# Altium integrated library Lattice CPLD ispLSI.IntLib: 471 symbols (part 12 of 26) (continued)
## ispLSI2128VE-250LT176 (continued)
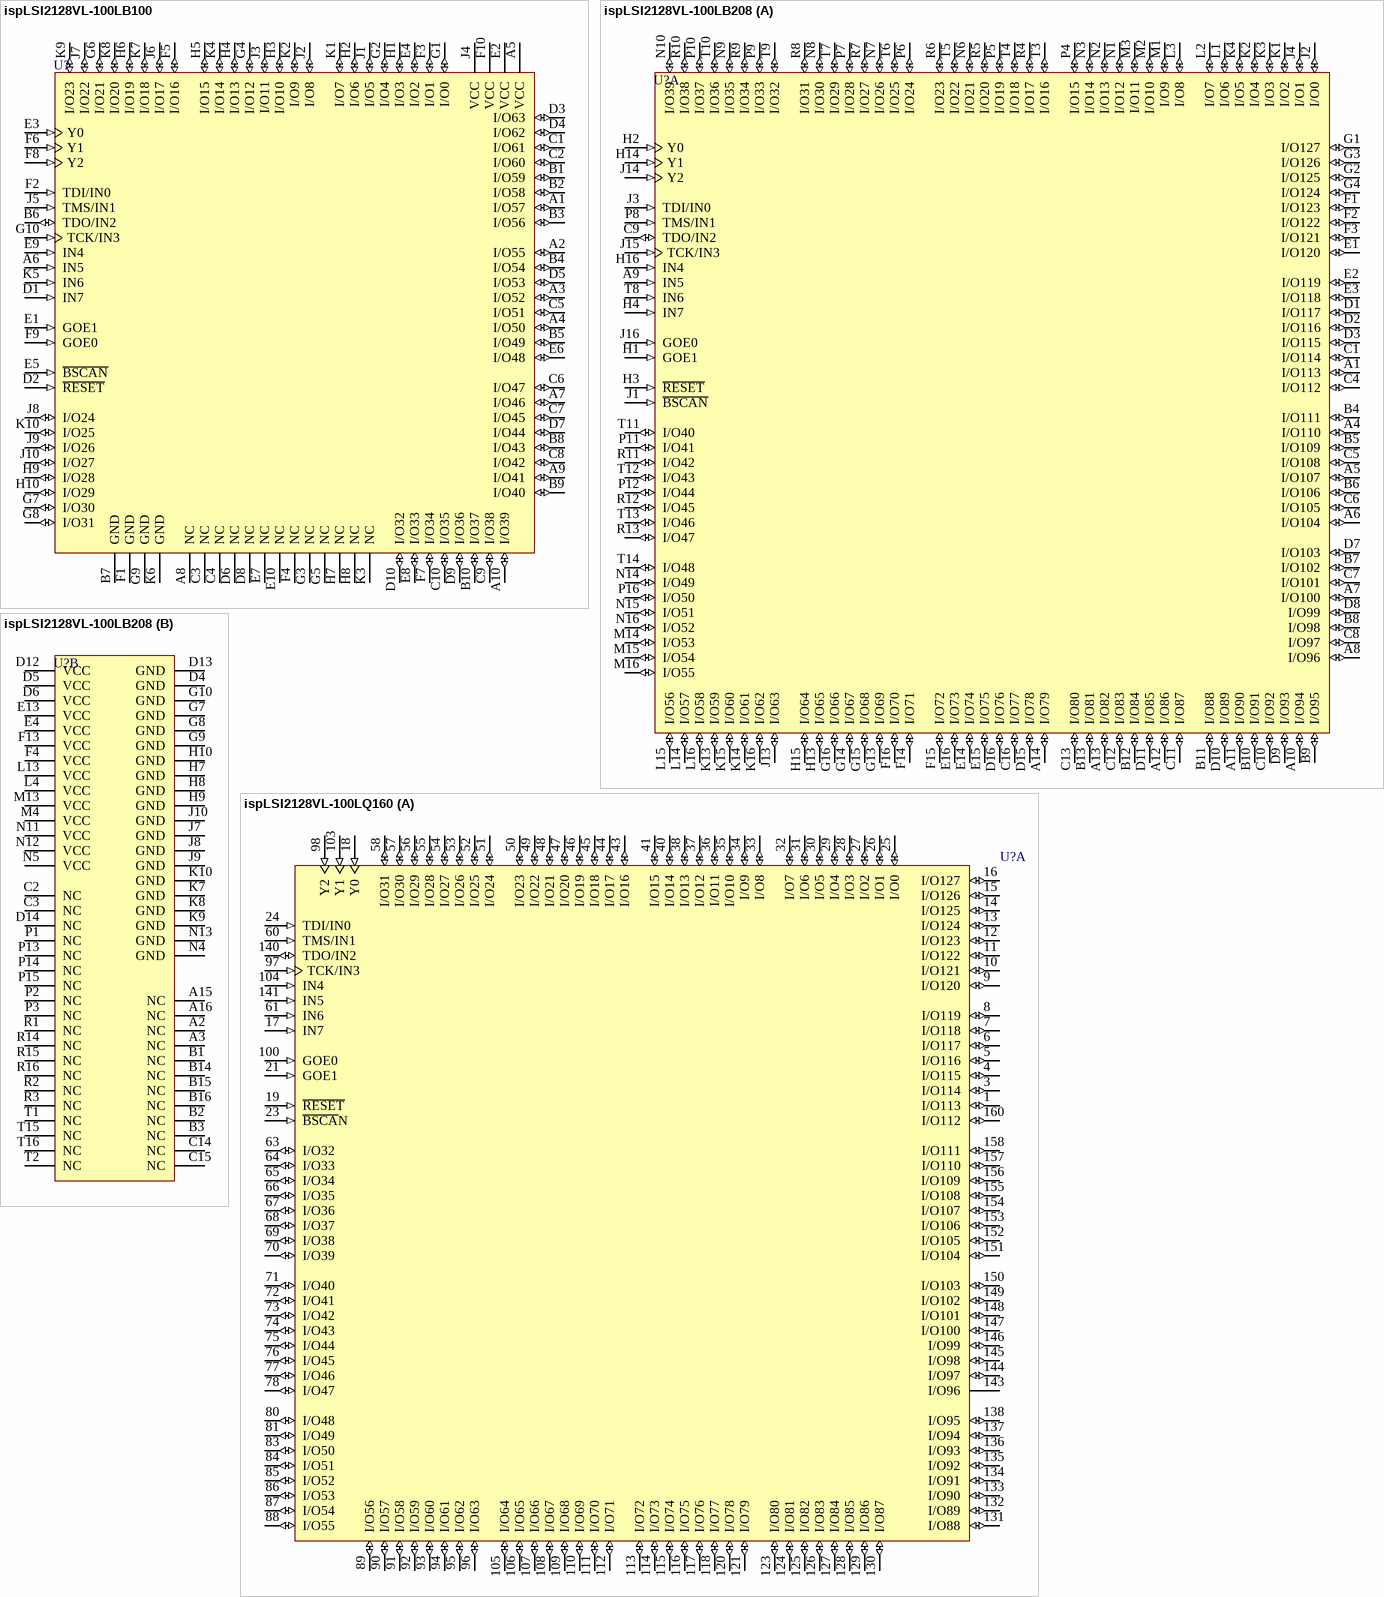
[diagram p103: symbols ispLSI2128VL-100LB100 to ispLSI2128VL-100LQ160]

## ispLSI2128VL-100LB100
designator U?
2.5V In-System Programmable SuperFAST High Density PLD; Published: 17-Jul-2002; LatestRevisionDate: 13-Apr-2006; LatestRevisionNote: IPC-7351 Footprint Added.; DatasheetVersion: Sep-2000; PackageVersion: pkg_32, Aug-2005; PackageReference: caBGA100; Publisher: Altium Limited; PackageDescription: 100-Ball Chip Array Ball Grid Array (caBGA100); ComponentLink1Description: Manufacturer Link; ComponentLink1URL: http://www.latticesemi.com/products/mature/index.cfm; ComponentLink2Description: Datasheet; ComponentLink2URL: http://www.latticesemi.com/lit/docs/datasheets/cpld/2128vl.pdf
footprint caBGA100 (BGA, 100-Leads, Body 10x10mm, Pitch 0.8mm)
3D model 2128VL-caBGA100 (100-Ball Chip Array Ball Grid Array (caBGA100))
pins: A1 I/O57 (io), A2 I/O55 (io), A3 I/O52 (io), A4 I/O50 (io), A5 VCC (power), A6 IN5 (in), A7 I/O46 (io), A8 NC, A9 I/O41 (io), A10 I/O39 (io), B1 I/O59 (io), B2 I/O58 (io), B3 I/O56 (io), B4 I/O54 (io), B5 I/O49 (io), B6 TDO/IN2 (io), B7 GND (power), B8 I/O43 (io), B9 I/O40 (io), B10 I/O37 (io), C1 I/O61 (io), C2 I/O60 (io), C3 NC, C4 NC, C5 I/O51 (io), C6 I/O47 (io), C7 I/O45 (io), C8 I/O42 (io), C9 I/O38 (io), C10 I/O35 (io), D1 IN7 (in), D2 ~{RESET} (in), D3 I/O63 (io), D4 I/O62 (io), D5 I/O53 (io), D6 NC, D7 I/O44 (io), D8 NC, D9 I/O36 (io), D10 I/O32 (io), E1 GOE1 (in), E2 VCC (power), E3 Y0 (in), E4 I/O2 (io), E5 ~{BSCAN} (in), E6 I/O48 (io), E7 NC, E8 I/O33 (io), E9 IN4 (in), E10 NC, F1 GND (power), F2 TDI/IN0 (in), F3 I/O1 (io), F4 NC, F5 I/O16 (io), F6 Y1 (in), F7 I/O34 (io), F8 Y2 (in), F9 GOE0 (in), F10 VCC (power), G1 I/O0 (io), G2 I/O4 (io), G3 NC, G4 I/O12 (io), G5 NC, G6 I/O21 (io), G7 I/O30 (io), G8 I/O31 (io), G9 GND (power), G10 TCK/IN3 (in), H1 I/O3 (io), H2 I/O6 (io), H3 I/O10 (io), H4 I/O13 (io), H5 I/O15 (io), H6 I/O19 (io), H7 NC, H8 NC, H9 I/O28 (io), H10 I/O29 (io), J1 I/O5 (io), J2 I/O8 (io), J3 I/O11 (io), J4 VCC (power), J5 TMS/IN1 (in), J6 I/O17 (io), J7 I/O22 (io), J8 I/O24 (io), J9 I/O26 (io), J10 I/O27 (io), K1 I/O7 (io), K2 I/O9 (io), K3 NC, K4 I/O14 (io), K5 IN6 (in), K6 GND (power), K7 I/O18 (io), K8 I/O20 (io), K9 I/O23 (io), K10 I/O25 (io)

## ispLSI2128VL-100LB208
designator U?
2.5V In-System Programmable SuperFAST High Density PLD; Published: 17-Jul-2002; LatestRevisionDate: 13-Apr-2006; LatestRevisionNote: IPC-7351 Footprint Added.; DatasheetVersion: Sep-2000; PackageVersion: pkg_32, Aug-2005; PackageReference: fpBGA208; Publisher: Altium Limited; PackageDescription: 208-Ball Fine Pitch Ball Grid Array (fpBGA208); ComponentLink1Description: Manufacturer Link; ComponentLink1URL: http://www.latticesemi.com/products/mature/index.cfm; ComponentLink2Description: Datasheet; ComponentLink2URL: http://www.latticesemi.com/lit/docs/datasheets/cpld/2128vl.pdf
footprint fpBGA208 (BGA, 208-Leads, Body 17x17mm, Pitch 1mm)
3D model 2128VL-fpBGA208 (208-Ball Fine Pitch Ball Grid Array (fpBGA208))
part A pins: A1 I/O113 (io), A4 I/O110 (io), A5 I/O107 (io), A6 I/O104 (io), A7 I/O100 (io), A8 I/O96 (io), A9 IN5 (in), A10 I/O94 (io), A11 I/O90 (io), A12 I/O86 (io), A13 I/O82 (io), A14 I/O79 (io), B4 I/O111 (io), B5 I/O109 (io), B6 I/O106 (io), B7 I/O102 (io), B8 I/O98 (io), B9 I/O95 (io), B10 I/O91 (io), B11 I/O88 (io), B12 I/O84 (io), B13 I/O81 (io), C1 I/O114 (io), C4 I/O112 (io), C5 I/O108 (io), C6 I/O105 (io), C7 I/O101 (io), C8 I/O97 (io), C9 TDO/IN2 (io), C10 I/O92 (io), C11 I/O87 (io), C12 I/O83 (io), C13 I/O80 (io), C16 I/O77 (io), D1 I/O117 (io), D2 I/O116 (io), D3 I/O115 (io), D7 I/O103 (io), D8 I/O99 (io), D9 I/O93 (io), D10 I/O89 (io), D11 I/O85 (io), D15 I/O78 (io), D16 I/O76 (io), E1 I/O120 (io), E2 I/O119 (io), E3 I/O118 (io), E14 I/O74 (io), E15 I/O75 (io), E16 I/O73 (io), F1 I/O123 (io), F2 I/O122 (io), F3 I/O121 (io), F14 I/O71 (io), F15 I/O72 (io), F16 I/O70 (io), G1 I/O127 (io), G2 I/O125 (io), G3 I/O126 (io), G4 I/O124 (io), G13 I/O69 (io), G14 I/O67 (io), G15 I/O68 (io), G16 I/O66 (io), H1 GOE1 (in), H2 Y0 (in), H3 ~{RESET} (in), H4 IN7 (in), H13 I/O65 (io), H14 Y1 (in), H15 I/O64 (io), H16 IN4 (in), J1 ~{BSCAN} (in), J2 I/O0 (io), J3 TDI/IN0 (in), J4 I/O1 (io), J13 I/O63 (io), J14 Y2 (in), J15 TCK/IN3 (in), J16 GOE0 (in), K1 I/O2 (io), K2 I/O4 (io), K3 I/O3 (io), K4 I/O5 (io), K13 I/O59 (io), K14 I/O61 (io), K15 I/O60 (io), K16 I/O62 (io), L1 I/O6 (io), L2 I/O7 (io), L3 I/O8 (io), L14 I/O57 (io), L15 I/O56 (io), L16 I/O58 (io), M1 I/O9 (io), M2 I/O10 (io), M3 I/O11 (io), M14 I/O53 (io), M15 I/O54 (io), M16 I/O55 (io), N1 I/O12 (io), N2 I/O13 (io), N3 I/O14 (io), N6 I/O21 (io), N7 I/O26 (io), N8 I/O30 (io), N9 I/O35 (io), N10 I/O39 (io), N14 I/O49 (io), N15 I/O51 (io), N16 I/O52 (io), P4 I/O15 (io), P5 I/O19 (io), P6 I/O24 (io), P7 I/O28 (io), P8 TMS/IN1 (in), P9 I/O33 (io), P10 I/O37 (io), P11 I/O41 (io), P12 I/O44 (io), P16 I/O50 (io), R4 I/O17 (io), R5 I/O20 (io), R6 I/O23 (io), R7 I/O27 (io), R8 I/O31 (io), R9 I/O34 (io), R10 I/O38 (io), R11 I/O42 (io), R12 I/O45 (io), R13 I/O47 (io), T3 I/O16 (io), T4 I/O18 (io), T5 I/O22 (io), T6 I/O25 (io), T7 I/O29 (io), T8 IN6 (in), T9 I/O32 (io), T10 I/O36 (io), T11 I/O40 (io), T12 I/O43 (io), T13 I/O46 (io), T14 I/O48 (io)
part B pins: A2 NC, A3 NC, A15 NC, A16 NC, B1 NC, B2 NC, B3 NC, B14 NC, B15 NC, B16 NC, C2 NC, C3 NC, C14 NC, C15 NC, D4 GND (power), D5 VCC (power), D6 VCC (power), D12 VCC (power), D13 GND (power), D14 NC, E4 VCC (power), E13 VCC (power), F4 VCC (power), F13 VCC (power), G7 GND (power), G8 GND (power), G9 GND (power), G10 GND (power), H7 GND (power), H8 GND (power), H9 GND (power), H10 GND (power), J7 GND (power), J8 GND (power), J9 GND (power), J10 GND (power), K7 GND (power), K8 GND (power), K9 GND (power), K10 GND (power), L4 VCC (power), L13 VCC (power), M4 VCC (power), M13 VCC (power), N4 GND (power), N5 VCC (power), N11 VCC (power), N12 VCC (power), N13 GND (power), P1 NC, P2 NC, P3 NC, P13 NC, P14 NC, P15 NC, R1 NC, R2 NC, R3 NC, R14 NC, R15 NC, R16 NC, T1 NC, T2 NC, T15 NC, T16 NC

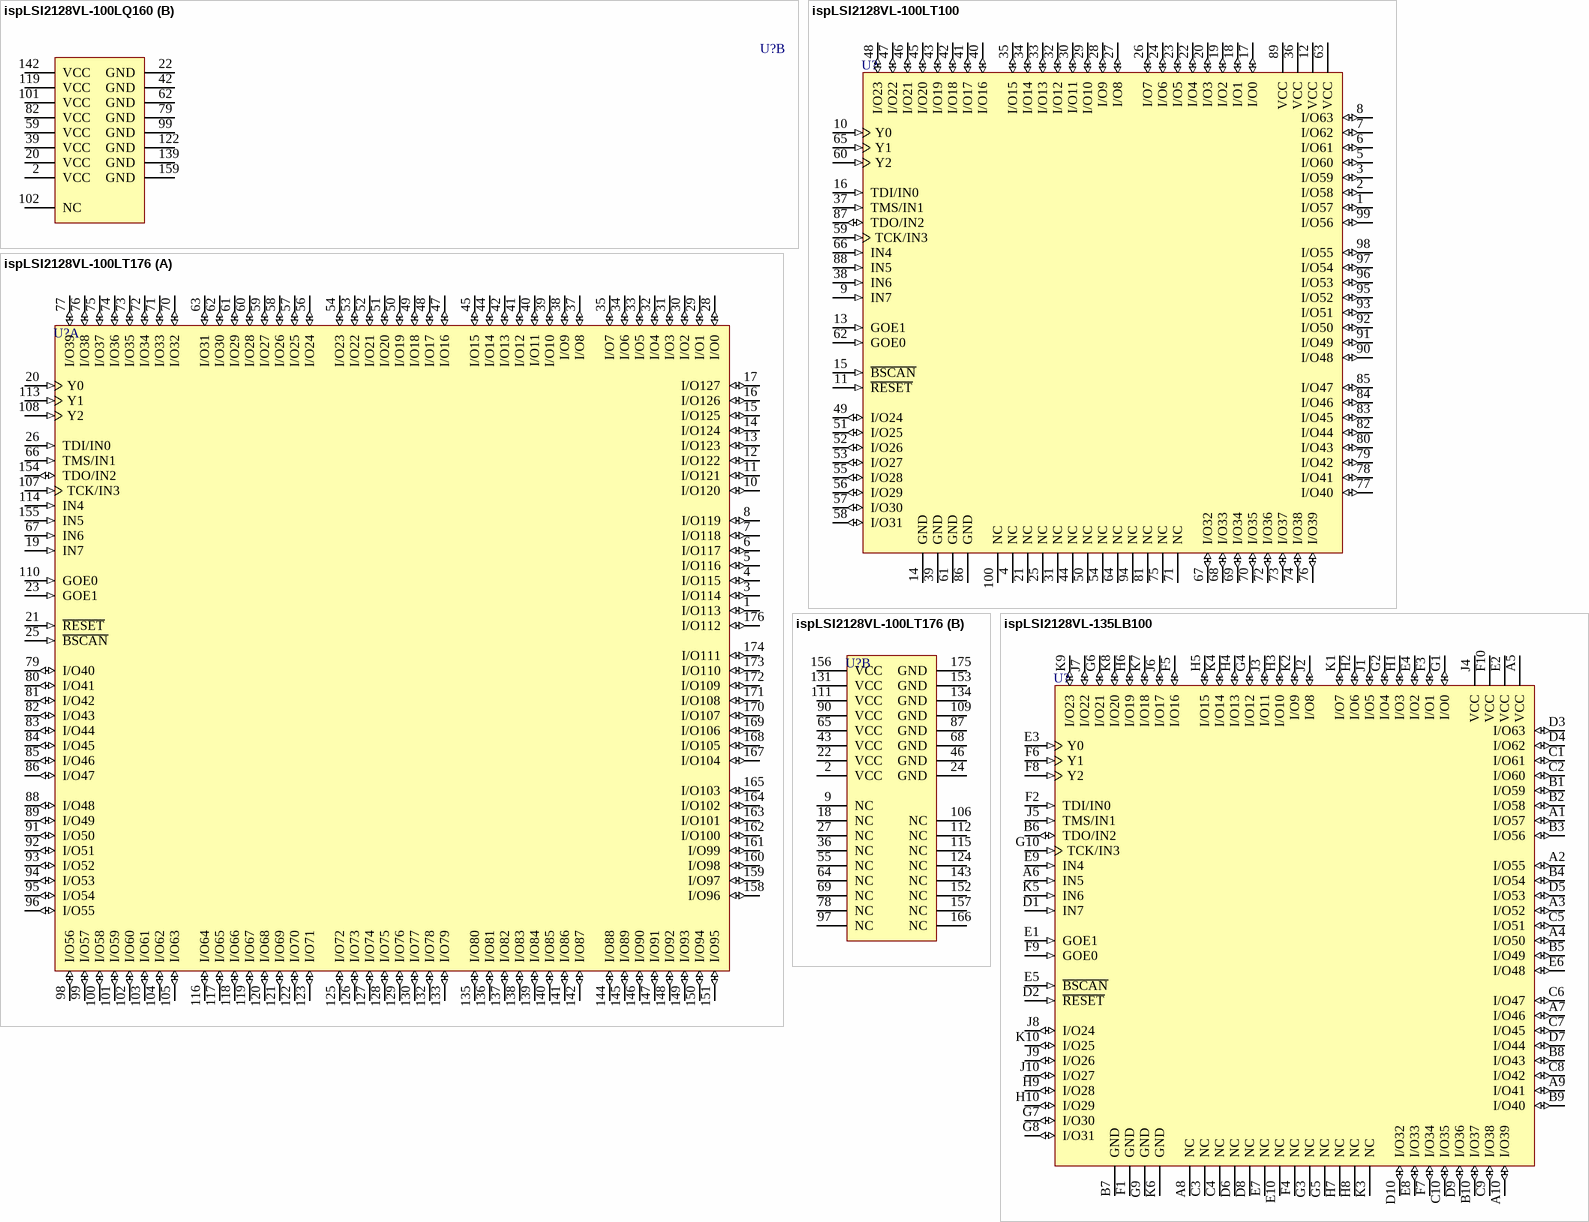
[diagram p104: symbols ispLSI2128VL-100LQ160 to ispLSI2128VL-135LB100]

## ispLSI2128VL-100LQ160
designator U?
2.5V In-System Programmable SuperFAST High Density PLD; Published: 17-Jul-2002; LatestRevisionDate: 13-Apr-2006; LatestRevisionNote: IPC-7351 Footprint Added.; DatasheetVersion: Sep-2000; PackageVersion: pkg_32, Aug-2005; PackageReference: PQFP160; Publisher: Altium Limited; PackageDescription: 160-Pin Quad Flat Pack 0.65 mm Pitch; Code_IPC: QFP65P3120X3120-160; ComponentLink1Description: Manufacturer Link; ComponentLink1URL: http://www.latticesemi.com/products/mature/index.cfm; ComponentLink2Description: Datasheet; ComponentLink2URL: http://www.latticesemi.com/lit/docs/datasheets/cpld/2128vl.pdf
footprint PQFP160_N (QFP, 160-Leads, Body 28 x 28mm, Pitch 0.65mm, IPC Medium Density)
footprint PQFP160_L (QFP, 160-Leads, Body 28 x 28mm, Pitch 0.65mm, IPC High Density)
footprint PQFP160_M (QFP, 160-Leads, Body 28 x 28mm, Pitch 0.65mm, IPC Low Density)
3D model 2128VL-PQFP160 (160-Pin Quad Flat Pack 0.65 mm Pitch)
part A pins: 1 I/O113 (io), 3 I/O114 (io), 4 I/O115 (io), 5 I/O116 (io), 6 I/O117 (io), 7 I/O118 (io), 8 I/O119 (io), 9 I/O120 (io), 10 I/O121 (io), 11 I/O122 (io), 12 I/O123 (io), 13 I/O124 (io), 14 I/O125 (io), 15 I/O126 (io), 16 I/O127 (io), 17 IN7 (in), 18 Y0 (in), 19 ~{RESET} (in), 21 GOE1 (in), 23 ~{BSCA}N (in), 24 TDI/IN0 (in), 25 I/O0 (io), 26 I/O1 (io), 27 I/O2 (io), 28 I/O3 (io), 29 I/O4 (io), 30 I/O5 (io), 31 I/O6 (io), 32 I/O7 (io), 33 I/O8 (io), 34 I/O9 (io), 35 I/O10 (io), 36 I/O11 (io), 37 I/O12 (io), 38 I/O13 (io), 40 I/O14 (io), 41 I/O15 (io), 43 I/O16 (io), 44 I/O17 (io), 45 I/O18 (io), 46 I/O19 (io), 47 I/O20 (io), 48 I/O21 (io), 49 I/O22 (io), 50 I/O23 (io), 51 I/O24 (io), 52 I/O25 (io), 53 I/O26 (io), 54 I/O27 (io), 55 I/O28 (io), 56 I/O29 (io), 57 I/O30 (io), 58 I/O31 (io), 60 TMS/IN1 (in), 61 IN6 (in), 63 I/O32 (io), 64 I/O33 (io), 65 I/O34 (io), 66 I/O35 (io), 67 I/O36 (io), 68 I/O37 (io), 69 I/O38 (io), 70 I/O39 (io), 71 I/O40 (io), 72 I/O41 (io), 73 I/O42 (io), 74 I/O43 (io), 75 I/O44 (io), 76 I/O45 (io), 77 I/O46 (io), 78 I/O47 (io), 80 I/O48 (io), 81 I/O49 (io), 83 I/O50 (io), 84 I/O51 (io), 85 I/O52 (io), 86 I/O53 (io), 87 I/O54 (io), 88 I/O55 (io), 89 I/O56 (io), 90 I/O57 (io), 91 I/O58 (io), 92 I/O59 (io), 93 I/O60 (io), 94 I/O61 (io), 95 I/O62 (io), 96 I/O63 (io), 97 TCK/IN3 (in), 98 Y2 (in), 100 GOE0 (in), 103 Y1 (in), 104 IN4 (in), 105 I/O64 (io), 106 I/O65 (io), 107 I/O66 (io), 108 I/O67 (io), 109 I/O68 (io), 110 I/O69 (io), 111 I/O70 (io), 112 I/O71 (io), 113 I/O72 (io), 114 I/O73 (io), 115 I/O74 (io), 116 I/O75 (io), 117 I/O76 (io), 118 I/O77 (io), 120 I/O78 (io), 121 I/O79 (io), 123 I/O80 (io), 124 I/O81 (io), 125 I/O82 (io), 126 I/O83 (io), 127 I/O84 (io), 128 I/O85 (io), 129 I/O86 (io), 130 I/O87 (io), 131 I/O88 (io), 132 I/O89 (io), 133 I/O90 (io), 134 I/O91 (io), 135 I/O92 (io), 136 I/O93 (io), 137 I/O94 (io), 138 I/O95 (io), 140 TDO/IN2 (io), 141 IN5 (in), 143 I/O96 (power), 144 I/O97 (io), 145 I/O98 (io), 146 I/O99 (io), 147 I/O100 (io), 148 I/O101 (io), 149 I/O102 (io), 150 I/O103 (io), 151 I/O104 (io), 152 I/O105 (io), 153 I/O106 (io), 154 I/O107 (io), 155 I/O108 (io), 156 I/O109 (io), 157 I/O110 (io), 158 I/O111 (io), 160 I/O112 (io)
part B pins: 2 VCC (power), 20 VCC (power), 22 GND (power), 39 VCC (power), 42 GND (power), 59 VCC (power), 62 GND (power), 79 GND (power), 82 VCC (power), 99 GND (power), 101 VCC (power), 102 NC, 119 VCC (power), 122 GND (power), 139 GND (power), 142 VCC (power), 159 GND (power)

## ispLSI2128VL-100LT100
designator U?
2.5V In-System Programmable SuperFAST High Density PLD; Published: 17-Jul-2002; LatestRevisionDate: 13-Apr-2006; LatestRevisionNote: IPC-7351 Footprint Added.; DatasheetVersion: Sep-2000; PackageVersion: pkg_32, Aug-2005; PackageReference: TQFP100; Publisher: Altium Limited; PackageDescription: 100-Pin Thin Quad Flat Pack (TQFP100); Code_JEDEC: MS-026-BED; ComponentLink1Description: Manufacturer Link; ComponentLink1URL: http://www.latticesemi.com/products/mature/index.cfm; ComponentLink2Description: Datasheet; ComponentLink2URL: http://www.latticesemi.com/lit/docs/datasheets/cpld/2128vl.pdf
footprint TQFP100_N (Thin QFP, 100-Leads, Body 14x14mm, Pitch 0.5mm, IPC Medium Density)
footprint TQFP100_L (Thin QFP, 100-Leads, Body 14x14mm, Pitch 0.5mm, IPC High Density)
footprint TQFP100_M (Thin QFP, 100-Leads, Body 14x14mm, Pitch 0.5mm, IPC Low Density)
3D model 2128VL-TQFP100 (100-Pin Thin Quad Flat Pack (TQFP100))
pins: 1 I/O57 (io), 2 I/O58 (io), 3 I/O59 (io), 4 NC, 5 I/O60 (io), 6 I/O61 (io), 7 I/O62 (io), 8 I/O63 (io), 9 IN7 (in), 10 Y0 (in), 11 ~{RESET} (in), 12 VCC (power), 13 GOE1 (in), 14 GND (power), 15 ~{BSCAN} (in), 16 TDI/IN0 (in), 17 I/O0 (io), 18 I/O1 (io), 19 I/O2 (io), 20 I/O3 (io), 21 NC, 22 I/O4 (io), 23 I/O5 (io), 24 I/O6 (io), 25 NC, 26 I/O7 (io), 27 I/O8 (io), 28 I/O9 (io), 29 I/O10 (io), 30 I/O11 (io), 31 NC, 32 I/O12 (io), 33 I/O13 (io), 34 I/O14 (io), 35 I/O15 (io), 36 VCC (power), 37 TMS/IN1 (in), 38 IN6 (in), 39 GND (power), 40 I/O16 (io), 41 I/O17 (io), 42 I/O18 (io), 43 I/O19 (io), 44 NC, 45 I/O20 (io), 46 I/O21 (io), 47 I/O22 (io), 48 I/O23 (io), 49 I/O24 (io), 50 NC, 51 I/O25 (io), 52 I/O26 (io), 53 I/O27 (io), 54 NC, 55 I/O28 (io), 56 I/O29 (io), 57 I/O30 (io), 58 I/O31 (io), 59 TCK/IN3 (in), 60 Y2 (in), 61 GND (power), 62 GOE0 (in), 63 VCC (power), 64 NC, 65 Y1 (in), 66 IN4 (in), 67 I/O32 (io), 68 I/O33 (io), 69 I/O34 (io), 70 I/O35 (io), 71 NC, 72 I/O36 (io), 73 I/O37 (io), 74 I/O38 (io), 75 NC, 76 I/O39 (io), 77 I/O40 (io), 78 I/O41 (io), 79 I/O42 (io), 80 I/O43 (io), 81 NC, 82 I/O44 (io), 83 I/O45 (io), 84 I/O46 (io), 85 I/O47 (io), 86 GND (power), 87 TDO/IN2 (io), 88 IN5 (in), 89 VCC (power), 90 I/O48 (io), 91 I/O49 (io), 92 I/O50 (io), 93 I/O51 (io), 94 NC, 95 I/O52 (io), 96 I/O53 (io), 97 I/O54 (io), 98 I/O55 (io), 99 I/O56 (io), 100 NC

## ispLSI2128VL-100LT176
designator U?
2.5V In-System Programmable SuperFAST High Density PLD; Published: 17-Jul-2002; LatestRevisionDate: 13-Apr-2006; LatestRevisionNote: IPC-7351 Footprint Added.; DatasheetVersion: Sep-2000; PackageVersion: pkg_32, Aug-2005; PackageReference: TQFP176; Publisher: Altium Limited; PackageDescription: 176-Pin Thin Quad Flat Pack 0.5 mm Pitch; ComponentLink1Description: Manufacturer Link; ComponentLink1URL: http://www.latticesemi.com/products/mature/index.cfm; ComponentLink2Description: Datasheet; ComponentLink2URL: http://www.latticesemi.com/lit/docs/datasheets/cpld/2128vl.pdf
footprint TQFP176_N (Thin QFP, 176-Leads, Body 24x24mm, Pitch 0.5mm, IPC Medium Density)
footprint TQFP176_L (Thin QFP, 176-Leads, Body 24x24mm, Pitch 0.5mm, IPC High Density)
footprint TQFP176_M (Thin QFP, 176-Leads, Body 24x24mm, Pitch 0.5mm, IPC Low Density)
3D model 2128VL-TQFP176 (176-Pin Thin Quad Flat Pack 0.5 mm Pitch)
part A pins: 1 I/O113 (io), 3 I/O114 (io), 4 I/O115 (io), 5 I/O116 (io), 6 I/O117 (io), 7 I/O118 (io), 8 I/O119 (io), 10 I/O120 (io), 11 I/O121 (io), 12 I/O122 (io), 13 I/O123 (io), 14 I/O124 (io), 15 I/O125 (io), 16 I/O126 (io), 17 I/O127 (io), 19 IN7 (in), 20 Y0 (in), 21 ~{RESET} (in), 23 GOE1 (in), 25 ~{BSCAN} (in), 26 TDI/IN0 (in), 28 I/O0 (io), 29 I/O1 (io), 30 I/O2 (io), 31 I/O3 (io), 32 I/O4 (io), 33 I/O5 (io), 34 I/O6 (io), 35 I/O7 (io), 37 I/O8 (io), 38 I/O9 (io), 39 I/O10 (io), 40 I/O11 (io), 41 I/O12 (io), 42 I/O13 (io), 44 I/O14 (io), 45 I/O15 (io), 47 I/O16 (io), 48 I/O17 (io), 49 I/O18 (io), 50 I/O19 (io), 51 I/O20 (io), 52 I/O21 (io), 53 I/O22 (io), 54 I/O23 (io), 56 I/O24 (io), 57 I/O25 (io), 58 I/O26 (io), 59 I/O27 (io), 60 I/O28 (io), 61 I/O29 (io), 62 I/O30 (io), 63 I/O31 (io), 66 TMS/IN1 (in), 67 IN6 (in), 70 I/O32 (io), 71 I/O33 (io), 72 I/O34 (io), 73 I/O35 (io), 74 I/O36 (io), 75 I/O37 (io), 76 I/O38 (io), 77 I/O39 (io), 79 I/O40 (io), 80 I/O41 (io), 81 I/O42 (io), 82 I/O43 (io), 83 I/O44 (io), 84 I/O45 (io), 85 I/O46 (io), 86 I/O47 (io), 88 I/O48 (io), 89 I/O49 (io), 91 I/O50 (io), 92 I/O51 (io), 93 I/O52 (io), 94 I/O53 (io), 95 I/O54 (io), 96 I/O55 (io), 98 I/O56 (io), 99 I/O57 (io), 100 I/O58 (io), 101 I/O59 (io), 102 I/O60 (io), 103 I/O61 (io), 104 I/O62 (io), 105 I/O63 (io), 107 TCK/IN3 (in), 108 Y2 (in), 110 GOE0 (in), 113 Y1 (in), 114 IN4 (in), 116 I/O64 (io), 117 I/O65 (io), 118 I/O66 (io), 119 I/O67 (io), 120 I/O68 (io), 121 I/O69 (io), 122 I/O70 (io), 123 I/O71 (io), 125 I/O72 (io), 126 I/O73 (io), 127 I/O74 (io), 128 I/O75 (io), 129 I/O76 (io), 130 I/O77 (io), 132 I/O78 (io), 133 I/O79 (io), 135 I/O80 (io), 136 I/O81 (io), 137 I/O82 (io), 138 I/O83 (io), 139 I/O84 (io), 140 I/O85 (io), 141 I/O86 (io), 142 I/O87 (io), 144 I/O88 (io), 145 I/O89 (io), 146 I/O90 (io), 147 I/O91 (io), 148 I/O92 (io), 149 I/O93 (io), 150 I/O94 (io), 151 I/O95 (io), 154 TDO/IN2 (io), 155 IN5 (in), 158 I/O96 (io), 159 I/O97 (io), 160 I/O98 (io), 161 I/O99 (io), 162 I/O100 (io), 163 I/O101 (io), 164 I/O102 (io), 165 I/O103 (io), 167 I/O104 (io), 168 I/O105 (io), 169 I/O106 (io), 170 I/O107 (io), 171 I/O108 (io), 172 I/O109 (io), 173 I/O110 (io), 174 I/O111 (io), 176 I/O112 (io)
part B pins: 2 VCC (power), 9 NC, 18 NC, 22 VCC (power), 24 GND (power), 27 NC, 36 NC, 43 VCC (power), 46 GND (power), 55 NC, 64 NC, 65 VCC (power), 68 GND (power), 69 NC, 78 NC, 87 GND (power), 90 VCC (power), 97 NC, 106 NC, 109 GND (power), 111 VCC (power), 112 NC, 115 NC, 124 NC, 131 VCC (power), 134 GND (power), 143 NC, 152 NC, 153 GND (power), 156 VCC (power), 157 NC, 166 NC, 175 GND (power)

## ispLSI2128VL-135LB100
designator U?
2.5V In-System Programmable SuperFAST High Density PLD; Published: 17-Jul-2002; LatestRevisionDate: 13-Apr-2006; LatestRevisionNote: IPC-7351 Footprint Added.; DatasheetVersion: Sep-2000; PackageVersion: pkg_32, Aug-2005; PackageReference: caBGA100; Publisher: Altium Limited; PackageDescription: 100-Ball Chip Array Ball Grid Array (caBGA100); ComponentLink1Description: Manufacturer Link; ComponentLink1URL: http://www.latticesemi.com/products/mature/index.cfm; ComponentLink2Description: Datasheet; ComponentLink2URL: http://www.latticesemi.com/lit/docs/datasheets/cpld/2128vl.pdf
footprint caBGA100 (BGA, 100-Leads, Body 10x10mm, Pitch 0.8mm)
3D model 2128VL-caBGA100 (100-Ball Chip Array Ball Grid Array (caBGA100))
pins: A1 I/O57 (io), A2 I/O55 (io), A3 I/O52 (io), A4 I/O50 (io), A5 VCC (power), A6 IN5 (in), A7 I/O46 (io), A8 NC, A9 I/O41 (io), A10 I/O39 (io), B1 I/O59 (io), B2 I/O58 (io), B3 I/O56 (io), B4 I/O54 (io), B5 I/O49 (io), B6 TDO/IN2 (io), B7 GND (power), B8 I/O43 (io), B9 I/O40 (io), B10 I/O37 (io), C1 I/O61 (io), C2 I/O60 (io), C3 NC, C4 NC, C5 I/O51 (io), C6 I/O47 (io), C7 I/O45 (io), C8 I/O42 (io), C9 I/O38 (io), C10 I/O35 (io), D1 IN7 (in), D2 ~{RESET} (in), D3 I/O63 (io), D4 I/O62 (io), D5 I/O53 (io), D6 NC, D7 I/O44 (io), D8 NC, D9 I/O36 (io), D10 I/O32 (io), E1 GOE1 (in), E2 VCC (power), E3 Y0 (in), E4 I/O2 (io), E5 ~{BSCAN} (in), E6 I/O48 (io), E7 NC, E8 I/O33 (io), E9 IN4 (in), E10 NC, F1 GND (power), F2 TDI/IN0 (in), F3 I/O1 (io), F4 NC, F5 I/O16 (io), F6 Y1 (in), F7 I/O34 (io), F8 Y2 (in), F9 GOE0 (in), F10 VCC (power), G1 I/O0 (io), G2 I/O4 (io), G3 NC, G4 I/O12 (io), G5 NC, G6 I/O21 (io), G7 I/O30 (io), G8 I/O31 (io), G9 GND (power), G10 TCK/IN3 (in), H1 I/O3 (io), H2 I/O6 (io), H3 I/O10 (io), H4 I/O13 (io), H5 I/O15 (io), H6 I/O19 (io), H7 NC, H8 NC, H9 I/O28 (io), H10 I/O29 (io), J1 I/O5 (io), J2 I/O8 (io), J3 I/O11 (io), J4 VCC (power), J5 TMS/IN1 (in), J6 I/O17 (io), J7 I/O22 (io), J8 I/O24 (io), J9 I/O26 (io), J10 I/O27 (io), K1 I/O7 (io), K2 I/O9 (io), K3 NC, K4 I/O14 (io), K5 IN6 (in), K6 GND (power), K7 I/O18 (io), K8 I/O20 (io), K9 I/O23 (io), K10 I/O25 (io)

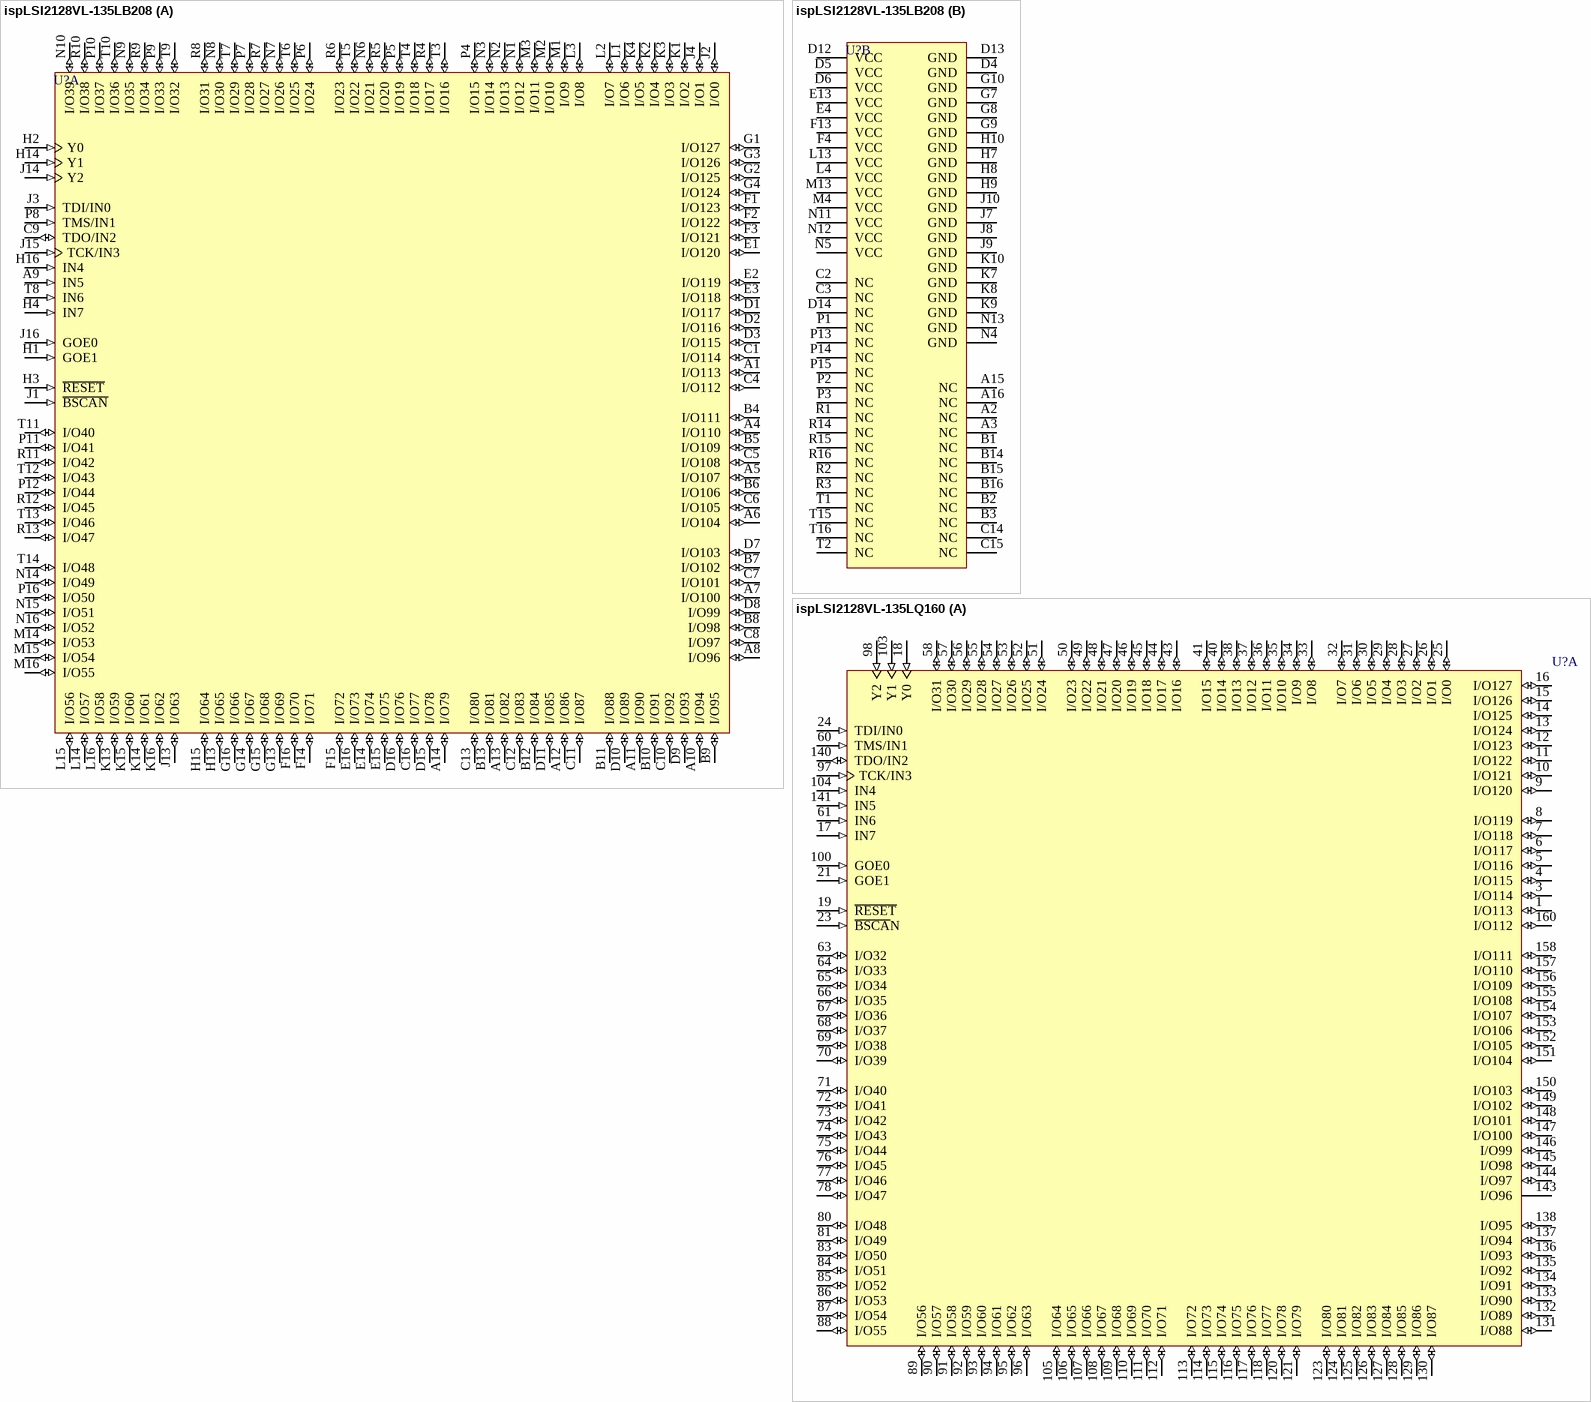
[diagram p105: symbols ispLSI2128VL-135LB208 to ispLSI2128VL-135LQ160]

## ispLSI2128VL-135LB208
designator U?
2.5V In-System Programmable SuperFAST High Density PLD; Published: 17-Jul-2002; LatestRevisionDate: 13-Apr-2006; LatestRevisionNote: IPC-7351 Footprint Added.; DatasheetVersion: Sep-2000; PackageVersion: pkg_32, Aug-2005; PackageReference: fpBGA208; Publisher: Altium Limited; PackageDescription: 208-Ball Fine Pitch Ball Grid Array (fpBGA208); ComponentLink1Description: Manufacturer Link; ComponentLink1URL: http://www.latticesemi.com/products/mature/index.cfm; ComponentLink2Description: Datasheet; ComponentLink2URL: http://www.latticesemi.com/lit/docs/datasheets/cpld/2128vl.pdf
footprint fpBGA208 (BGA, 208-Leads, Body 17x17mm, Pitch 1mm)
3D model 2128VL-fpBGA208 (208-Ball Fine Pitch Ball Grid Array (fpBGA208))
part A pins: A1 I/O113 (io), A4 I/O110 (io), A5 I/O107 (io), A6 I/O104 (io), A7 I/O100 (io), A8 I/O96 (io), A9 IN5 (in), A10 I/O94 (io), A11 I/O90 (io), A12 I/O86 (io), A13 I/O82 (io), A14 I/O79 (io), B4 I/O111 (io), B5 I/O109 (io), B6 I/O106 (io), B7 I/O102 (io), B8 I/O98 (io), B9 I/O95 (io), B10 I/O91 (io), B11 I/O88 (io), B12 I/O84 (io), B13 I/O81 (io), C1 I/O114 (io), C4 I/O112 (io), C5 I/O108 (io), C6 I/O105 (io), C7 I/O101 (io), C8 I/O97 (io), C9 TDO/IN2 (io), C10 I/O92 (io), C11 I/O87 (io), C12 I/O83 (io), C13 I/O80 (io), C16 I/O77 (io), D1 I/O117 (io), D2 I/O116 (io), D3 I/O115 (io), D7 I/O103 (io), D8 I/O99 (io), D9 I/O93 (io), D10 I/O89 (io), D11 I/O85 (io), D15 I/O78 (io), D16 I/O76 (io), E1 I/O120 (io), E2 I/O119 (io), E3 I/O118 (io), E14 I/O74 (io), E15 I/O75 (io), E16 I/O73 (io), F1 I/O123 (io), F2 I/O122 (io), F3 I/O121 (io), F14 I/O71 (io), F15 I/O72 (io), F16 I/O70 (io), G1 I/O127 (io), G2 I/O125 (io), G3 I/O126 (io), G4 I/O124 (io), G13 I/O69 (io), G14 I/O67 (io), G15 I/O68 (io), G16 I/O66 (io), H1 GOE1 (in), H2 Y0 (in), H3 ~{RESET} (in), H4 IN7 (in), H13 I/O65 (io), H14 Y1 (in), H15 I/O64 (io), H16 IN4 (in), J1 ~{BSCAN} (in), J2 I/O0 (io), J3 TDI/IN0 (in), J4 I/O1 (io), J13 I/O63 (io), J14 Y2 (in), J15 TCK/IN3 (in), J16 GOE0 (in), K1 I/O2 (io), K2 I/O4 (io), K3 I/O3 (io), K4 I/O5 (io), K13 I/O59 (io), K14 I/O61 (io), K15 I/O60 (io), K16 I/O62 (io), L1 I/O6 (io), L2 I/O7 (io), L3 I/O8 (io), L14 I/O57 (io), L15 I/O56 (io), L16 I/O58 (io), M1 I/O9 (io), M2 I/O10 (io), M3 I/O11 (io), M14 I/O53 (io), M15 I/O54 (io), M16 I/O55 (io), N1 I/O12 (io), N2 I/O13 (io), N3 I/O14 (io), N6 I/O21 (io), N7 I/O26 (io), N8 I/O30 (io), N9 I/O35 (io), N10 I/O39 (io), N14 I/O49 (io), N15 I/O51 (io), N16 I/O52 (io), P4 I/O15 (io), P5 I/O19 (io), P6 I/O24 (io), P7 I/O28 (io), P8 TMS/IN1 (in), P9 I/O33 (io), P10 I/O37 (io), P11 I/O41 (io), P12 I/O44 (io), P16 I/O50 (io), R4 I/O17 (io), R5 I/O20 (io), R6 I/O23 (io), R7 I/O27 (io), R8 I/O31 (io), R9 I/O34 (io), R10 I/O38 (io), R11 I/O42 (io), R12 I/O45 (io), R13 I/O47 (io), T3 I/O16 (io), T4 I/O18 (io), T5 I/O22 (io), T6 I/O25 (io), T7 I/O29 (io), T8 IN6 (in), T9 I/O32 (io), T10 I/O36 (io), T11 I/O40 (io), T12 I/O43 (io), T13 I/O46 (io), T14 I/O48 (io)
part B pins: A2 NC, A3 NC, A15 NC, A16 NC, B1 NC, B2 NC, B3 NC, B14 NC, B15 NC, B16 NC, C2 NC, C3 NC, C14 NC, C15 NC, D4 GND (power), D5 VCC (power), D6 VCC (power), D12 VCC (power), D13 GND (power), D14 NC, E4 VCC (power), E13 VCC (power), F4 VCC (power), F13 VCC (power), G7 GND (power), G8 GND (power), G9 GND (power), G10 GND (power), H7 GND (power), H8 GND (power), H9 GND (power), H10 GND (power), J7 GND (power), J8 GND (power), J9 GND (power), J10 GND (power), K7 GND (power), K8 GND (power), K9 GND (power), K10 GND (power), L4 VCC (power), L13 VCC (power), M4 VCC (power), M13 VCC (power), N4 GND (power), N5 VCC (power), N11 VCC (power), N12 VCC (power), N13 GND (power), P1 NC, P2 NC, P3 NC, P13 NC, P14 NC, P15 NC, R1 NC, R2 NC, R3 NC, R14 NC, R15 NC, R16 NC, T1 NC, T2 NC, T15 NC, T16 NC

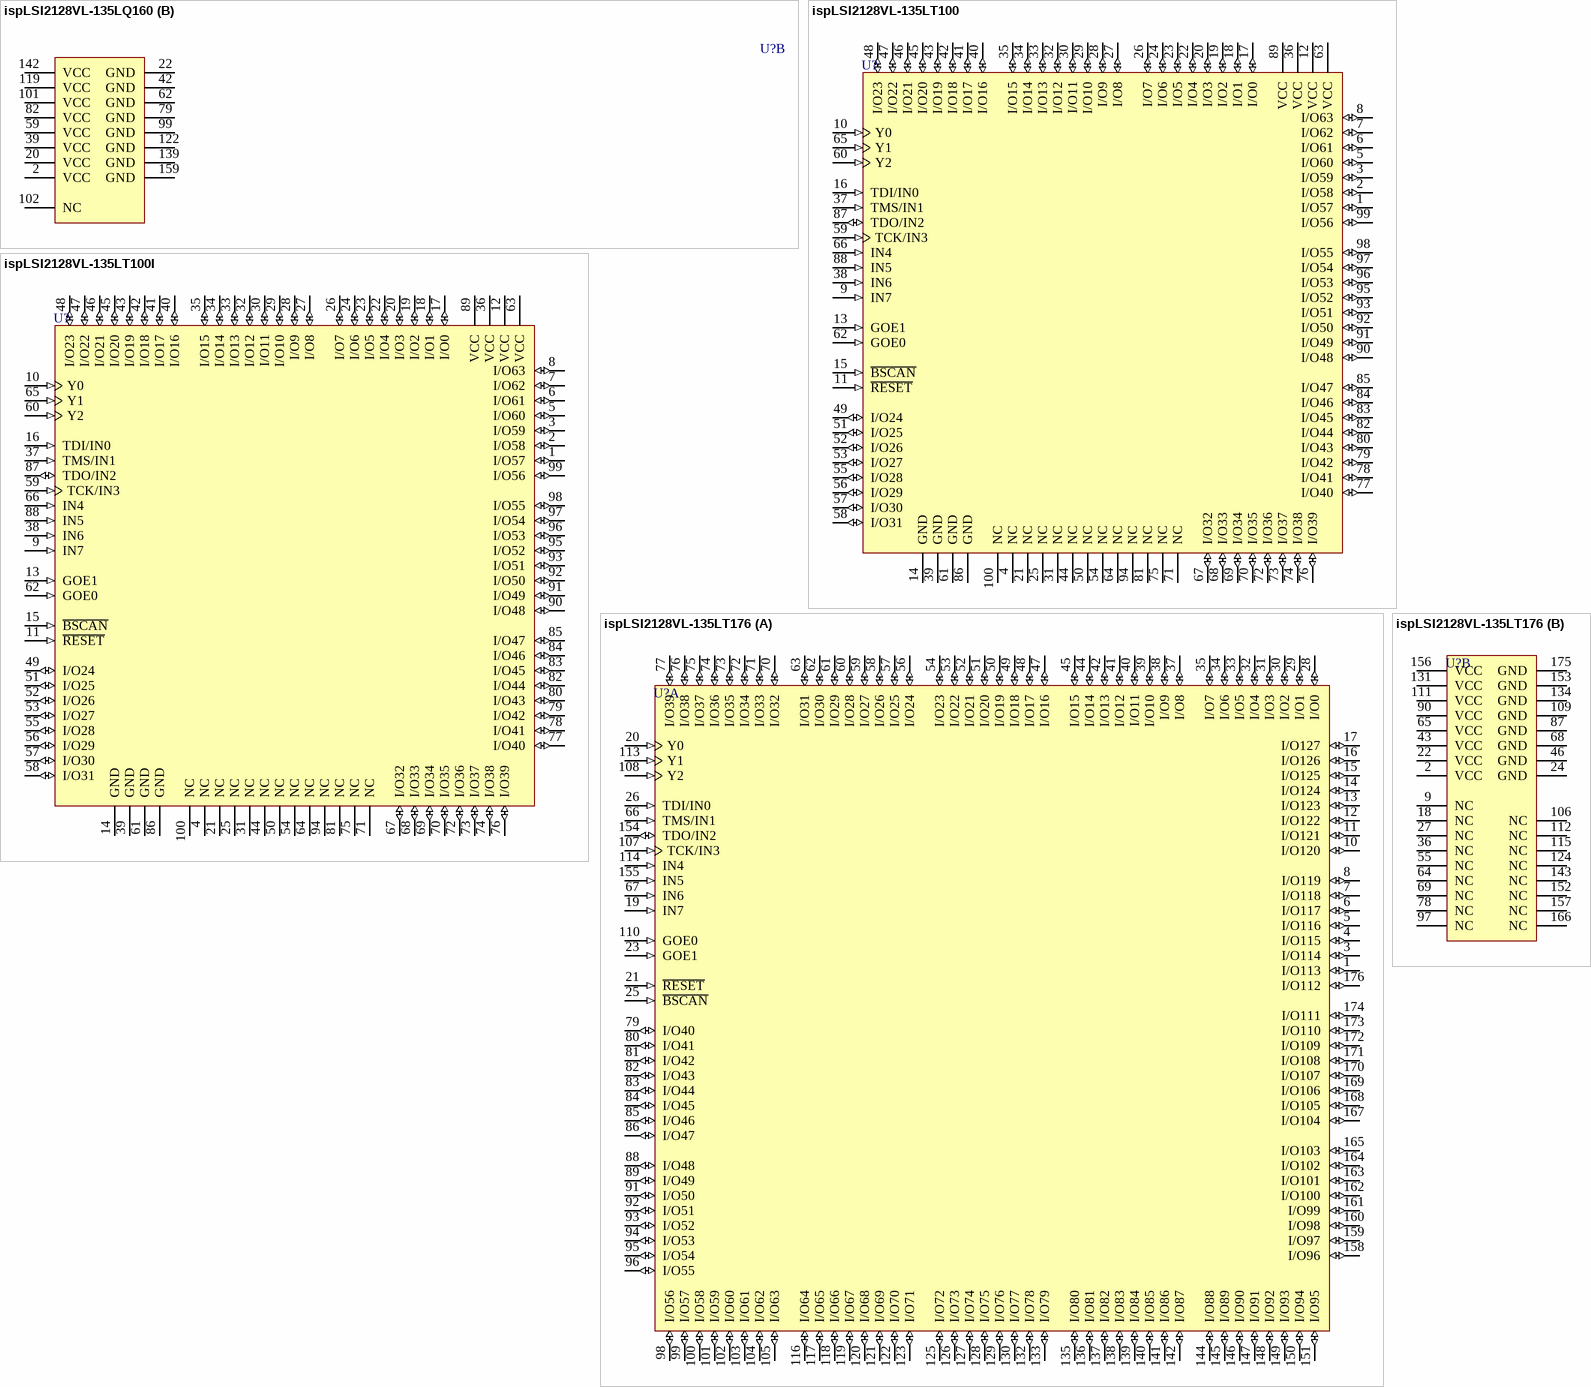
[diagram p106: symbols ispLSI2128VL-135LQ160 to ispLSI2128VL-135LT176]

## ispLSI2128VL-135LQ160
designator U?
2.5V In-System Programmable SuperFAST High Density PLD; Published: 17-Jul-2002; LatestRevisionDate: 13-Apr-2006; LatestRevisionNote: IPC-7351 Footprint Added.; DatasheetVersion: Sep-2000; PackageVersion: pkg_32, Aug-2005; PackageReference: PQFP160; Publisher: Altium Limited; PackageDescription: 160-Pin Quad Flat Pack 0.65 mm Pitch; Code_IPC: QFP65P3120X3120-160; ComponentLink1Description: Manufacturer Link; ComponentLink1URL: http://www.latticesemi.com/products/mature/index.cfm; ComponentLink2Description: Datasheet; ComponentLink2URL: http://www.latticesemi.com/lit/docs/datasheets/cpld/2128vl.pdf
footprint PQFP160_N (QFP, 160-Leads, Body 28 x 28mm, Pitch 0.65mm, IPC Medium Density)
footprint PQFP160_L (QFP, 160-Leads, Body 28 x 28mm, Pitch 0.65mm, IPC High Density)
footprint PQFP160_M (QFP, 160-Leads, Body 28 x 28mm, Pitch 0.65mm, IPC Low Density)
3D model 2128VL-PQFP160 (160-Pin Quad Flat Pack 0.65 mm Pitch)
part A pins: 1 I/O113 (io), 3 I/O114 (io), 4 I/O115 (io), 5 I/O116 (io), 6 I/O117 (io), 7 I/O118 (io), 8 I/O119 (io), 9 I/O120 (io), 10 I/O121 (io), 11 I/O122 (io), 12 I/O123 (io), 13 I/O124 (io), 14 I/O125 (io), 15 I/O126 (io), 16 I/O127 (io), 17 IN7 (in), 18 Y0 (in), 19 ~{RESET} (in), 21 GOE1 (in), 23 ~{BSCA}N (in), 24 TDI/IN0 (in), 25 I/O0 (io), 26 I/O1 (io), 27 I/O2 (io), 28 I/O3 (io), 29 I/O4 (io), 30 I/O5 (io), 31 I/O6 (io), 32 I/O7 (io), 33 I/O8 (io), 34 I/O9 (io), 35 I/O10 (io), 36 I/O11 (io), 37 I/O12 (io), 38 I/O13 (io), 40 I/O14 (io), 41 I/O15 (io), 43 I/O16 (io), 44 I/O17 (io), 45 I/O18 (io), 46 I/O19 (io), 47 I/O20 (io), 48 I/O21 (io), 49 I/O22 (io), 50 I/O23 (io), 51 I/O24 (io), 52 I/O25 (io), 53 I/O26 (io), 54 I/O27 (io), 55 I/O28 (io), 56 I/O29 (io), 57 I/O30 (io), 58 I/O31 (io), 60 TMS/IN1 (in), 61 IN6 (in), 63 I/O32 (io), 64 I/O33 (io), 65 I/O34 (io), 66 I/O35 (io), 67 I/O36 (io), 68 I/O37 (io), 69 I/O38 (io), 70 I/O39 (io), 71 I/O40 (io), 72 I/O41 (io), 73 I/O42 (io), 74 I/O43 (io), 75 I/O44 (io), 76 I/O45 (io), 77 I/O46 (io), 78 I/O47 (io), 80 I/O48 (io), 81 I/O49 (io), 83 I/O50 (io), 84 I/O51 (io), 85 I/O52 (io), 86 I/O53 (io), 87 I/O54 (io), 88 I/O55 (io), 89 I/O56 (io), 90 I/O57 (io), 91 I/O58 (io), 92 I/O59 (io), 93 I/O60 (io), 94 I/O61 (io), 95 I/O62 (io), 96 I/O63 (io), 97 TCK/IN3 (in), 98 Y2 (in), 100 GOE0 (in), 103 Y1 (in), 104 IN4 (in), 105 I/O64 (io), 106 I/O65 (io), 107 I/O66 (io), 108 I/O67 (io), 109 I/O68 (io), 110 I/O69 (io), 111 I/O70 (io), 112 I/O71 (io), 113 I/O72 (io), 114 I/O73 (io), 115 I/O74 (io), 116 I/O75 (io), 117 I/O76 (io), 118 I/O77 (io), 120 I/O78 (io), 121 I/O79 (io), 123 I/O80 (io), 124 I/O81 (io), 125 I/O82 (io), 126 I/O83 (io), 127 I/O84 (io), 128 I/O85 (io), 129 I/O86 (io), 130 I/O87 (io), 131 I/O88 (io), 132 I/O89 (io), 133 I/O90 (io), 134 I/O91 (io), 135 I/O92 (io), 136 I/O93 (io), 137 I/O94 (io), 138 I/O95 (io), 140 TDO/IN2 (io), 141 IN5 (in), 143 I/O96 (power), 144 I/O97 (io), 145 I/O98 (io), 146 I/O99 (io), 147 I/O100 (io), 148 I/O101 (io), 149 I/O102 (io), 150 I/O103 (io), 151 I/O104 (io), 152 I/O105 (io), 153 I/O106 (io), 154 I/O107 (io), 155 I/O108 (io), 156 I/O109 (io), 157 I/O110 (io), 158 I/O111 (io), 160 I/O112 (io)
part B pins: 2 VCC (power), 20 VCC (power), 22 GND (power), 39 VCC (power), 42 GND (power), 59 VCC (power), 62 GND (power), 79 GND (power), 82 VCC (power), 99 GND (power), 101 VCC (power), 102 NC, 119 VCC (power), 122 GND (power), 139 GND (power), 142 VCC (power), 159 GND (power)

## ispLSI2128VL-135LT100
designator U?
2.5V In-System Programmable SuperFAST High Density PLD; Published: 17-Jul-2002; LatestRevisionDate: 13-Apr-2006; LatestRevisionNote: IPC-7351 Footprint Added.; DatasheetVersion: Sep-2000; PackageVersion: pkg_32, Aug-2005; PackageReference: TQFP100; Publisher: Altium Limited; PackageDescription: 100-Pin Thin Quad Flat Pack (TQFP100); Code_JEDEC: MS-026-BED; ComponentLink1Description: Manufacturer Link; ComponentLink1URL: http://www.latticesemi.com/products/mature/index.cfm; ComponentLink2Description: Datasheet; ComponentLink2URL: http://www.latticesemi.com/lit/docs/datasheets/cpld/2128vl.pdf
footprint TQFP100_N (Thin QFP, 100-Leads, Body 14x14mm, Pitch 0.5mm, IPC Medium Density)
footprint TQFP100_L (Thin QFP, 100-Leads, Body 14x14mm, Pitch 0.5mm, IPC High Density)
footprint TQFP100_M (Thin QFP, 100-Leads, Body 14x14mm, Pitch 0.5mm, IPC Low Density)
3D model 2128VL-TQFP100 (100-Pin Thin Quad Flat Pack (TQFP100))
pins: 1 I/O57 (io), 2 I/O58 (io), 3 I/O59 (io), 4 NC, 5 I/O60 (io), 6 I/O61 (io), 7 I/O62 (io), 8 I/O63 (io), 9 IN7 (in), 10 Y0 (in), 11 ~{RESET} (in), 12 VCC (power), 13 GOE1 (in), 14 GND (power), 15 ~{BSCAN} (in), 16 TDI/IN0 (in), 17 I/O0 (io), 18 I/O1 (io), 19 I/O2 (io), 20 I/O3 (io), 21 NC, 22 I/O4 (io), 23 I/O5 (io), 24 I/O6 (io), 25 NC, 26 I/O7 (io), 27 I/O8 (io), 28 I/O9 (io), 29 I/O10 (io), 30 I/O11 (io), 31 NC, 32 I/O12 (io), 33 I/O13 (io), 34 I/O14 (io), 35 I/O15 (io), 36 VCC (power), 37 TMS/IN1 (in), 38 IN6 (in), 39 GND (power), 40 I/O16 (io), 41 I/O17 (io), 42 I/O18 (io), 43 I/O19 (io), 44 NC, 45 I/O20 (io), 46 I/O21 (io), 47 I/O22 (io), 48 I/O23 (io), 49 I/O24 (io), 50 NC, 51 I/O25 (io), 52 I/O26 (io), 53 I/O27 (io), 54 NC, 55 I/O28 (io), 56 I/O29 (io), 57 I/O30 (io), 58 I/O31 (io), 59 TCK/IN3 (in), 60 Y2 (in), 61 GND (power), 62 GOE0 (in), 63 VCC (power), 64 NC, 65 Y1 (in), 66 IN4 (in), 67 I/O32 (io), 68 I/O33 (io), 69 I/O34 (io), 70 I/O35 (io), 71 NC, 72 I/O36 (io), 73 I/O37 (io), 74 I/O38 (io), 75 NC, 76 I/O39 (io), 77 I/O40 (io), 78 I/O41 (io), 79 I/O42 (io), 80 I/O43 (io), 81 NC, 82 I/O44 (io), 83 I/O45 (io), 84 I/O46 (io), 85 I/O47 (io), 86 GND (power), 87 TDO/IN2 (io), 88 IN5 (in), 89 VCC (power), 90 I/O48 (io), 91 I/O49 (io), 92 I/O50 (io), 93 I/O51 (io), 94 NC, 95 I/O52 (io), 96 I/O53 (io), 97 I/O54 (io), 98 I/O55 (io), 99 I/O56 (io), 100 NC

## ispLSI2128VL-135LT100I
designator U?
2.5V In-System Programmable SuperFAST High Density PLD; Published: 17-Jul-2002; LatestRevisionDate: 13-Apr-2006; LatestRevisionNote: IPC-7351 Footprint Added.; DatasheetVersion: Sep-2000; PackageVersion: pkg_32, Aug-2005; PackageReference: TQFP100; Publisher: Altium Limited; PackageDescription: 100-Pin Thin Quad Flat Pack (TQFP100); Code_JEDEC: MS-026-BED; ComponentLink1Description: Manufacturer Link; ComponentLink1URL: http://www.latticesemi.com/products/mature/index.cfm; ComponentLink2Description: Datasheet; ComponentLink2URL: http://www.latticesemi.com/lit/docs/datasheets/cpld/2128vl.pdf
footprint TQFP100_N (Thin QFP, 100-Leads, Body 14x14mm, Pitch 0.5mm, IPC Medium Density)
footprint TQFP100_L (Thin QFP, 100-Leads, Body 14x14mm, Pitch 0.5mm, IPC High Density)
footprint TQFP100_M (Thin QFP, 100-Leads, Body 14x14mm, Pitch 0.5mm, IPC Low Density)
3D model 2128VL-TQFP100 (100-Pin Thin Quad Flat Pack (TQFP100))
pins: 1 I/O57 (io), 2 I/O58 (io), 3 I/O59 (io), 4 NC, 5 I/O60 (io), 6 I/O61 (io), 7 I/O62 (io), 8 I/O63 (io), 9 IN7 (in), 10 Y0 (in), 11 ~{RESET} (in), 12 VCC (power), 13 GOE1 (in), 14 GND (power), 15 ~{BSCAN} (in), 16 TDI/IN0 (in), 17 I/O0 (io), 18 I/O1 (io), 19 I/O2 (io), 20 I/O3 (io), 21 NC, 22 I/O4 (io), 23 I/O5 (io), 24 I/O6 (io), 25 NC, 26 I/O7 (io), 27 I/O8 (io), 28 I/O9 (io), 29 I/O10 (io), 30 I/O11 (io), 31 NC, 32 I/O12 (io), 33 I/O13 (io), 34 I/O14 (io), 35 I/O15 (io), 36 VCC (power), 37 TMS/IN1 (in), 38 IN6 (in), 39 GND (power), 40 I/O16 (io), 41 I/O17 (io), 42 I/O18 (io), 43 I/O19 (io), 44 NC, 45 I/O20 (io), 46 I/O21 (io), 47 I/O22 (io), 48 I/O23 (io), 49 I/O24 (io), 50 NC, 51 I/O25 (io), 52 I/O26 (io), 53 I/O27 (io), 54 NC, 55 I/O28 (io), 56 I/O29 (io), 57 I/O30 (io), 58 I/O31 (io), 59 TCK/IN3 (in), 60 Y2 (in), 61 GND (power), 62 GOE0 (in), 63 VCC (power), 64 NC, 65 Y1 (in), 66 IN4 (in), 67 I/O32 (io), 68 I/O33 (io), 69 I/O34 (io), 70 I/O35 (io), 71 NC, 72 I/O36 (io), 73 I/O37 (io), 74 I/O38 (io), 75 NC, 76 I/O39 (io), 77 I/O40 (io), 78 I/O41 (io), 79 I/O42 (io), 80 I/O43 (io), 81 NC, 82 I/O44 (io), 83 I/O45 (io), 84 I/O46 (io), 85 I/O47 (io), 86 GND (power), 87 TDO/IN2 (io), 88 IN5 (in), 89 VCC (power), 90 I/O48 (io), 91 I/O49 (io), 92 I/O50 (io), 93 I/O51 (io), 94 NC, 95 I/O52 (io), 96 I/O53 (io), 97 I/O54 (io), 98 I/O55 (io), 99 I/O56 (io), 100 NC